# Altium schematic symbol library 13-Logicold 逻辑 IC.SchLib: 297 symbols (part 24 of 30) (continued)
## XC6VLX130T-1FFG1156C (continued)
part I pins: A25 IO_L3N_25  (io), A26 IO_L5N_25  (io), A28 IO_L13P_25  (io), A29 IO_L13N_25  (io), A30 IO_L15P_25  (io), A31 IO_L19N_GC_25  (io), B25 IO_L3P_25  (io), B26 IO_L5P_25  (io), B27 IO_L7P_25  (io), B28 IO_L9N_MRCC_25  (io), B30 IO_L15N_25  (io), B31 IO_L19P_GC_25  (io), C24 IO_L1P_25  (io), C25 IO_L1N_25  (io), C27 IO_L7N_25  (io), C28 IO_L9P_MRCC_25  (io), C29 IO_L10P_MRCC_25  (io), C30 IO_L17P_25  (io), D24 IO_L8P_SRCC_25  (io), D25 IO_L0P_25  (io), D26 IO_L0N_25  (io), D27 IO_L4P_25  (io), D29 IO_L10N_MRCC_25  (io), D30 IO_L17N_25  (io), E24 IO_L8N_SRCC_25  (io), E26 IO_L2P_25  (io), E27 IO_L4N_VREF_25  (io), E28 IO_L14N_VREF_25  (io), E29 IO_L16P_VRN_25  (io), F25 IO_L11P_SRCC_25  (io), F26 IO_L2N_25  (io), F28 IO_L14P_25  (io), F29 IO_L16N_VRP_25  (io), G25 IO_L11N_SRCC_25  (io), G26 IO_L6P_25  (io), G27 IO_L6N_25  (io), G28 IO_L12N_25  (io), H27 IO_L12P_25  (io), H28 IO_L18P_GC_25  (io), H29 IO_L18N_GC_25  (io)
part J pins: A18 IO_L15P_26  (io), A19 IO_L15N_26  (io), A20 IO_L7P_26  (io), A21 IO_L7N_26  (io), A23 IO_L1P_26  (io), A24 IO_L1N_26  (io), B18 IO_L17P_26  (io), B20 IO_L9P_MRCC_26  (io), B21 IO_L5P_26  (io), B22 IO_L5N_26  (io), B23 IO_L3P_26  (io), C18 IO_L17N_26  (io), C19 IO_L9N_MRCC_26  (io), C20 IO_L0P_26  (io), C22 IO_L19P_26  (io), C23 IO_L3N_26  (io), D19 IO_L13N_26  (io), D20 IO_L0N_26  (io), D21 IO_L12P_VRN_26  (io), D22 IO_L19N_26  (io), E19 IO_L13P_26  (io), E21 IO_L12N_VRP_26  (io), E22 IO_L6P_26  (io), E23 IO_L6N_26  (io), F19 IO_L8P_SRCC_26  (io), F20 IO_L8N_SRCC_26  (io), F21 IO_L10P_MRCC_26  (io), G20 IO_L10N_MRCC_26  (io), G21 IO_L2P_26  (io), G22 IO_L2N_26  (io), H19 IO_L11P_SRCC_26  (io), H20 IO_L11N_SRCC_26  (io), H22 IO_L14P_26  (io), J20 IO_L4P_26  (io), J21 IO_L4N_VREF_26  (io), J22 IO_L14N_VREF_26  (io), K21 IO_L16P_26  (io), K22 IO_L16N_26  (io), L20 IO_L18P_26  (io), L21 IO_L18N_26  (io)
part K pins: AC15 IO_L9P_MRCC_32  (io), AC17 IO_L11N_SRCC_32  (io), AC18 IO_L11P_SRCC_32  (io), AD15 IO_L9N_MRCC_32  (io), AD16 IO_L10N_MRCC_32  (io), AD17 IO_L16P_32  (io), AE16 IO_L10P_MRCC_32  (io), AE17 IO_L16N_32  (io), AE18 IO_L18P_32  (io), AF15 IO_L0N_32  (io), AF16 IO_L4N_VREF_32  (io), AF18 IO_L18N_32  (io), AG15 IO_L0P_32  (io), AG16 IO_L4P_32  (io), AG17 IO_L8N_SRCC_32  (io), AG18 IO_L12N_VRP_32  (io), AH15 IO_L2N_32  (io), AH17 IO_L8P_SRCC_32  (io), AH18 IO_L12P_VRN_32  (io), AH19 IO_L14N_VREF_32  (io), AJ14 IO_L1N_32  (io), AJ15 IO_L2P_32  (io), AJ16 IO_L6N_32  (io), AJ17 IO_L6P_32  (io), AJ19 IO_L14P_32  (io), AK14 IO_L1P_32  (io), AK16 IO_L19N_32  (io), AK17 IO_L17N_32  (io), AK18 IO_L17P_32  (io), AL14 IO_L3N_32  (io), AL15 IO_L3P_32  (io), AL16 IO_L19P_32  (io), AM15 IO_L5N_32  (io), AM16 IO_L15N_32  (io), AM17 IO_L15P_32  (io), AN15 IO_L5P_32  (io), AN17 IO_L13P_32  (io), AP15 IO_L7N_32  (io), AP16 IO_L7P_32  (io), AP17 IO_L13N_32  (io)
part L pins: AC12 IO_L9N_MRCC_33  (io), AC13 IO_L9P_MRCC_33  (io), AC14 IO_L2N_33  (io), AD11 IO_L10N_MRCC_33  (io), AD12 IO_L10P_MRCC_33  (io), AD14 IO_L2P_33  (io), AE11 IO_L4N_VREF_33  (io), AE12 IO_L0N_33  (io), AE13 IO_L0P_33  (io), AE14 IO_L14P_33  (io), AF11 IO_L4P_33  (io), AF13 IO_L12P_VRN_33  (io), AF14 IO_L14N_VREF_33  (io), AG10 IO_L6N_33  (io), AG11 IO_L6P_33  (io), AG12 IO_L16P_33  (io), AG13 IO_L12N_VRP_33  (io), AH10 IO_L8N_SRCC_33  (io), AH12 IO_L16N_33  (io), AH13 IO_L18P_33  (io), AH14 IO_L18N_33  (io), AJ10 IO_L8P_SRCC_33  (io), AJ11 IO_L1P_33  (io), AJ12 IO_L3N_33  (io), AK11 IO_L1N_33  (io), AK12 IO_L3P_33  (io), AK13 IO_L17P_33  (io), AL10 IO_L5N_33  (io), AL11 IO_L7P_33  (io), AL13 IO_L17N_33  (io), AM10 IO_L5P_33  (io), AM11 IO_L7N_33  (io), AM12 IO_L13P_33  (io), AM13 IO_L15N_33  (io), AN12 IO_L13N_33  (io), AN13 IO_L15P_33  (io), AN14 IO_L19N_33  (io), AP11 IO_L11P_SRCC_33  (io), AP12 IO_L11N_SRCC_33  (io), AP14 IO_L19P_33  (io)
part M pins: A8 IO_L5N_A08_D24_34  (io), A9 IO_L5P_A09_D25_34  (io), A10 IO_L1P_GC_34  (io), AB10 IO_L10N_MRCC_34  (io), AC9 IO_L12N_A02_D18_34  (io), AC10 IO_L10P_MRCC_34  (io), AD9 IO_L14P_A25_34  (io), AD10 IO_L12P_A03_D19_34  (io), AE9 IO_L14N_VREF_A24_34  (io), AF9 IO_L16P_A21_34  (io), AF10 IO_L16N_A20_34  (io), AG8 IO_L18P_A17_34  (io), AH8 IO_L18N_A16_34  (io), AH9 IO_L11P_SRCC_34  (io), AJ9 IO_L11N_SRCC_34  (io), AK8 IO_L13P_A01_D17_34  (io), AK9 IO_L15P_A23_34  (io), AL8 IO_L13N_A00_D16_34  (io), AL9 IO_L15N_A22_34  (io), AN9 IO_L17P_A19_34  (io), AN10 IO_L19P_VRN_34  (io), AP9 IO_L17N_A18_34  (io), AP10 IO_L19N_VRP_34  (io), B8 IO_L7P_A05_D21_34  (io), B10 IO_L1N_GC_34  (io), C8 IO_L7N_A04_D20_34  (io), C9 IO_L4P_A11_D27_34  (io), C10 IO_L3P_A13_D29_34  (io), D9 IO_L4N_VREF_A10_D26_34  (io), D10 IO_L3N_A12_D28_34  (io), E8 IO_L6P_A07_D23_34  (io), E9 IO_L6N_A06_D22_34  (io), F9 IO_L2P_A15_D31_34  (io), F10 IO_L2N_A14_D30_34  (io), H9 IO_L0N_GC_34  (io), J9 IO_L0P_GC_34  (io), K9 IO_L8N_SRCC_34  (io), L9 IO_L8P_SRCC_34  (io), L10 IO_L9P_MRCC_34  (io), M10 IO_L9N_MRCC_34  (io)
part N pins: A11 IO_L13P_SM6P_35  (io), A13 IO_L3P_SM1P_35  (io), A14 IO_L3N_SM1N_35  (io), B11 IO_L13N_SM6N_35  (io), B12 IO_L7P_SM4P_35  (io), B13 IO_L7N_SM4N_35  (io), C12 IO_L11N_SRCC_35  (io), C13 IO_L11P_SRCC_35  (io), C14 IO_L1N_35  (io), D11 IO_L19P_GC_35  (io), D12 IO_L17P_35  (io), D14 IO_L1P_35  (io), E11 IO_L19N_GC_35  (io), E12 IO_L17N_35  (io), E13 IO_L15P_SM7P_35  (io), E14 IO_L5N_SM2N_35  (io), F11 IO_L2N_SM0N_35  (io), F13 IO_L15N_SM7N_35  (io), F14 IO_L5P_SM2P_35  (io), G10 IO_L6N_SM3N_35  (io), G11 IO_L2P_SM0P_35  (io), G12 IO_L4P_35  (io), G13 IO_L0P_35  (io), H10 IO_L6P_SM3P_35  (io), H12 IO_L12P_SM5P_35  (io), H13 IO_L4N_VREF_35  (io), H14 IO_L0N_35  (io), J10 IO_L14N_VREF_35  (io), J11 IO_L14P_35  (io), J12 IO_L12N_SM5N_35  (io), J14 IO_L8N_SRCC_35  (io), K11 IO_L16P_VRN_35  (io), K12 IO_L18N_GC_35  (io), K13 IO_L18P_GC_35  (io), K14 IO_L8P_SRCC_35  (io), L11 IO_L16N_VRP_35  (io), L13 IO_L9P_MRCC_35  (io), M11 IO_L10N_MRCC_35  (io), M12 IO_L10P_MRCC_35  (io), M13 IO_L9N_MRCC_35  (io)
part O pins: A15 IO_L15P_36  (io), A16 IO_L11P_SRCC_36  (io), B15 IO_L15N_36  (io), B16 IO_L11N_SRCC_36  (io), B17 IO_L5N_36  (io), C15 IO_L19N_36  (io), C17 IO_L5P_36  (io), D15 IO_L19P_36  (io), D16 IO_L13N_36  (io), D17 IO_L1N_36  (io), E16 IO_L13P_36  (io), E17 IO_L0N_36  (io), E18 IO_L1P_36  (io), F15 IO_L16N_36  (io), F16 IO_L12P_VRN_36  (io), F18 IO_L0P_36  (io), G15 IO_L16P_36  (io), G16 IO_L12N_VRP_36  (io), G17 IO_L3N_36  (io), G18 IO_L8P_SRCC_36  (io), H15 IO_L18P_36  (io), H17 IO_L3P_36  (io), H18 IO_L8N_SRCC_36  (io), J15 IO_L18N_36  (io), J16 IO_L14N_VREF_36  (io), J17 IO_L14P_36  (io), J19 IO_L6N_36  (io), K16 IO_L9P_MRCC_36  (io), K17 IO_L2N_36  (io), K18 IO_L2P_36  (io), K19 IO_L6P_36  (io), L14 IO_L10N_MRCC_36  (io), L15 IO_L10P_MRCC_36  (io), L16 IO_L9N_MRCC_36  (io), L18 IO_L4N_VREF_36  (io), L19 IO_L4P_36  (io), M15 IO_L17N_36  (io), M16 IO_L17P_36  (io), M17 IO_L7N_36  (io), M18 IO_L7P_36  (io)
part P pins: AH5 MGTREFCLK1N_112  (in), AH6 MGTREFCLK1P_112  (in), AJ3 MGTRXP3_112  (in), AJ4 MGTRXN3_112  (in), AK1 MGTTXP3_112  (out), AK2 MGTTXN3_112  (out), AK5 MGTREFCLK0N_112  (in), AK6 MGTREFCLK0P_112  (in), AL3 MGTRXP2_112  (in), AL4 MGTRXN2_112  (in), AM1 MGTTXP2_112  (out), AM2 MGTTXN2_112  (out), AM5 MGTRXP1_112  (in), AM6 MGTRXN1_112  (in), AN3 MGTTXP1_112  (out), AN4 MGTTXN1_112  (out), AP1 MGTTXP0_112  (out), AP2 MGTTXN0_112  (out), AP5 MGTRXP0_112  (in), AP6 MGTRXN0_112  (in)
part Q pins: AB1 MGTTXP3_113  (out), AB2 MGTTXN3_113  (out), AB5 MGTREFCLK1N_113  (in), AB6 MGTREFCLK1P_113  (in), AC3 MGTRXP3_113  (in), AC4 MGTRXN3_113  (in), AD1 MGTTXP2_113  (out), AD2 MGTTXN2_113  (out), AD5 MGTREFCLK0N_113  (in), AD6 MGTREFCLK0P_113  (in), AE3 MGTRXP2_113  (in), AE4 MGTRXN2_113  (in), AF1 MGTTXP1_113  (out), AF2 MGTTXN1_113  (out), AF5 MGTRXP1_113  (in), AF6 MGTRXN1_113  (in), AG3 MGTRXP0_113  (in), AG4 MGTRXN0_113  (in), AH1 MGTTXP0_113  (out), AH2 MGTTXN0_113  (out)
part R pins: AA3 MGTRXP0_114  (in), AA4 MGTRXN0_114  (in), P1 MGTTXP3_114  (out), P2 MGTTXN3_114  (out), R3 MGTRXP3_114  (in), R4 MGTRXN3_114  (in), T1 MGTTXP2_114  (out), T2 MGTTXN2_114  (out), T5 MGTREFCLK1N_114  (in), T6 MGTREFCLK1P_114  (in), U3 MGTRXP2_114  (in), U4 MGTRXN2_114  (in), V1 MGTTXP1_114  (out), V2 MGTTXN1_114  (out), V5 MGTREFCLK0N_114  (in), V6 MGTREFCLK0P_114  (in), W3 MGTRXP1_114  (in), W4 MGTRXN1_114  (in), Y1 MGTTXP0_114  (out), Y2 MGTTXN0_114  (out)
part S pins: AN7 MGTRREF_115  (in), AP7 MGTAVTTRCAL_115 , F1 MGTTXP3_115  (out), F2 MGTTXN3_115  (out), H1 MGTTXP2_115  (out), H2 MGTTXN2_115  (out), J3 MGTRXP3_115  (in), J4 MGTRXN3_115  (in), K1 MGTTXP1_115  (out), K2 MGTTXN1_115  (out), K5 MGTRXP2_115  (in), K6 MGTRXN2_115  (in), L3 MGTRXP1_115  (in), L4 MGTRXN1_115  (in), M1 MGTTXP0_115  (out), M2 MGTTXN0_115  (out), M5 MGTREFCLK1N_115  (in), M6 MGTREFCLK1P_115  (in), N3 MGTRXP0_115  (in), N4 MGTRXN0_115  (in), P5 MGTREFCLK0N_115  (in), P6 MGTREFCLK0P_115  (in)
part T pins: A3 MGTTXP3_116  (out), A4 MGTTXN3_116  (out), B1 MGTTXP2_116  (out), B2 MGTTXN2_116  (out), B5 MGTRXP3_116  (in), B6 MGTRXN3_116  (in), C3 MGTTXP1_116  (out), C4 MGTTXN1_116  (out), D1 MGTTXP0_116  (out), D2 MGTTXN0_116  (out), D5 MGTRXP2_116  (in), D6 MGTRXN2_116  (in), E3 MGTRXP1_116  (in), E4 MGTRXN1_116  (in), F5 MGTREFCLK1N_116  (in), F6 MGTREFCLK1P_116  (in), G3 MGTRXP0_116  (in), G4 MGTRXN0_116  (in), H5 MGTREFCLK0N_116  (in), H6 MGTREFCLK0P_116  (in)
part U pins: AA8 DOUT_BUSY_0  (out), AC8 TDO_0  (out), AD8 TDI_0  (in), AE8 TCK_0  (in), AF8 TMS_0  (in), F8 CSI_B_0  (in), G8 RDWR_B_0  (in), H8 DIN_0  (in), K8 CCLK_0  (io), L8 PROGRAM_B_0  (in), M8 HSWAPEN_0  (in), P8 INIT_B_0  (oc), R8 DONE_0  (io), U8 M0_0  (in), V8 M2_0  (in), W8 M1_0  (in), W17 DXN_0 , W18 DXP_0 
part V pins: A12 VCCO_35  (power), A22 VCCO_26  (power), A32 VCCO_16  (power), AA32 VCCO_13  (power), AB9 VCCO_0  (power), AB29 VCCO_13  (power), AC16 VCCO_32  (power), AC26 VCCO_13  (power), AD13 VCCO_33  (power), AD23 VCCO_24  (power), AD33 VCCO_13  (power), AE10 VCCO_34  (power), AE20 VCCO_22  (power), AE30 VCCO_13  (power), AF17 VCCO_32  (power), AF27 VCCO_12  (power), AG14 VCCO_33  (power), AG24 VCCO_24  (power), AG34 VCCO_12  (power), AH11 VCCO_33  (power), AH21 VCCO_22  (power), AH31 VCCO_12  (power), AJ8 VCCO_34  (power), AJ18 VCCO_32  (power), AJ28 VCCO_23  (power), AK15 VCCO_32  (power), AK25 VCCO_23  (power), AL12 VCCO_33  (power), AL22 VCCO_22  (power), AL32 VCCO_12  (power), AM9 VCCO_34  (power), AM19 VCCO_22  (power), AM29 VCCO_23  (power), AN16 VCCO_32  (power), AN26 VCCO_23  (power), AP13 VCCO_33  (power), AP23 VCCO_22  (power), B9 VCCO_34  (power), B19 VCCO_26  (power), B29 VCCO_25  (power), C16 VCCO_36  (power), C26 VCCO_25  (power), D13 VCCO_35  (power), D23 VCCO_26  (power), D33 VCCO_16  (power), E10 VCCO_34  (power), E20 VCCO_26  (power), E30 VCCO_25  (power), F17 VCCO_36  (power), F27 VCCO_25  (power), G14 VCCO_35  (power), G24 VCCO_24  (power), G34 VCCO_16  (power), H11 VCCO_35  (power), H21 VCCO_26  (power), H31 VCCO_16  (power), J18 VCCO_36  (power), J28 VCCO_16  (power), K15 VCCO_36  (power), K25 VCCO_16  (power), L12 VCCO_35  (power), L22 VCCO_24  (power), L32 VCCO_15  (power), M9 VCCO_34  (power), M29 VCCO_15  (power), N26 VCCO_15  (power), P33 VCCO_15  (power), R30 VCCO_15  (power), T27 VCCO_14  (power), U24 VCCO_24  (power), U34 VCCO_14  (power), V31 VCCO_14  (power), W28 VCCO_14  (power), Y9 VCCO_0  (power), Y25 VCCO_24  (power)
part W pins: AA6 MGTAVCC_S  (power), AC2 MGTAVTT_S  (power), AC6 MGTAVCC_S  (power), AD3 MGTAVTT_S  (power), AE6 MGTAVCC_S  (power), AG2 MGTAVTT_S  (power), AG6 MGTAVCC_S  (power), AH3 MGTAVTT_S  (power), AJ6 MGTAVCC_S  (power), AL2 MGTAVTT_S  (power), AL6 MGTAVCC_S  (power), AM3 MGTAVTT_S  (power), AN6 MGTAVCC_S  (power), C2 MGTAVTT_N  (power), C6 MGTAVCC_N  (power), D3 MGTAVTT_N  (power), E6 MGTAVCC_N  (power), G2 MGTAVTT_N  (power), G6 MGTAVCC_N  (power), H3 MGTAVTT_N  (power), J6 MGTAVCC_N  (power), L2 MGTAVTT_N  (power), L6 MGTAVCC_N  (power), M3 MGTAVTT_N  (power), N6 MGTAVCC_N  (power), N8 VBATT_0  (power), R2 MGTAVTT_S  (power), R6 MGTAVCC_S  (power), T3 MGTAVTT_S  (power), T17 AVSS_0  (power), T18 AVDD_0  (power), U6 MGTAVCC_S  (power), U17 VREFN_0  (power), U18 VP_0  (in), V17 VN_0  (in), V18 VREFP_0  (power), W2 MGTAVTT_S  (power), W6 MGTAVCC_S  (power), Y3 MGTAVTT_S  (power), Y8 VFS_0  (in)
part X pins: AA10 VCCAUX  (power), AA12 VCCINT  (power), AA14 VCCINT  (power), AA16 VCCINT  (power), AA18 VCCINT  (power), AA20 VCCINT  (power), AA22 VCCAUX  (power), AB11 VCCINT  (power), AB13 VCCINT  (power), AB15 VCCINT  (power), AB17 VCCINT  (power), AB19 VCCINT  (power), AB21 VCCINT  (power), M19 VCCINT  (power), M21 VCCINT  (power), N10 VCCAUX  (power), N12 VCCINT  (power), N14 VCCINT  (power), N16 VCCINT  (power), N18 VCCINT  (power), N20 VCCINT  (power), N22 VCCAUX  (power), P9 VCCAUX  (power), P11 VCCINT  (power), P13 VCCINT  (power), P15 VCCINT  (power), P17 VCCINT  (power), P19 VCCINT  (power), P21 VCCINT  (power), P23 VCCAUX  (power), R10 VCCINT  (power), R12 VCCINT  (power), R14 VCCINT  (power), R16 VCCINT  (power), R18 VCCINT  (power), R20 VCCINT  (power), R22 VCCAUX  (power), T9 VCCAUX  (power), T11 VCCINT  (power), T13 VCCINT  (power), T15 VCCINT  (power), T19 VCCINT  (power), T21 VCCINT  (power), U10 VCCINT  (power), U12 VCCINT  (power), U14 VCCINT  (power), U16 VCCINT  (power), U20 VCCINT  (power), U22 VCCAUX  (power), V9 VCCAUX  (power), V11 VCCINT  (power), V13 VCCINT  (power), V15 VCCINT  (power), V19 VCCINT  (power), V21 VCCINT  (power), W10 VCCAUX  (power), W12 VCCINT  (power), W14 VCCINT  (power), W16 VCCINT  (power), W20 VCCINT  (power), W22 VCCAUX  (power), Y11 VCCINT  (power), Y13 VCCINT  (power), Y15 VCCINT  (power), Y17 VCCINT  (power), Y19 VCCINT  (power), Y21 VCCINT  (power), Y23 VCCAUX  (power)
part Y pins: A1 GND  (power), A2 GND  (power), A5 GND  (power), A6 GND  (power), A7 GND  (power), A17 GND  (power), A27 GND  (power), A34 GND  (power), B3 GND  (power), B4 GND  (power), B7 GND  (power), B14 GND  (power), B24 GND  (power), C1 GND  (power), C5 GND  (power), C7 GND  (power), C11 GND  (power), C21 GND  (power), C31 GND  (power), D4 GND  (power), D7 GND  (power), D8 GND  (power), D18 GND  (power), D28 GND  (power), E1 GND  (power), E2 GND  (power), E5 GND  (power), E7 GND  (power), E15 GND  (power), E25 GND  (power), F3 GND  (power), F4 GND  (power), F7 GND  (power), F12 GND  (power), F22 GND  (power), F32 GND  (power), G1 GND  (power), G5 GND  (power), G7 GND  (power), G9 GND  (power), G19 GND  (power), G29 GND  (power), H4 GND  (power), H7 GND  (power), H16 GND  (power), H26 GND  (power), J1 GND  (power), J2 GND  (power), J5 GND  (power), J7 GND  (power), J8 GND  (power), J13 GND  (power), J23 GND  (power), J33 GND  (power), K3 GND  (power), K4 GND  (power), K7 GND  (power), K10 GND  (power), K20 GND  (power), K30 GND  (power), L1 GND  (power), L5 GND  (power), L7 GND  (power), L17 GND  (power), L27 GND  (power), M4 GND  (power), M7 GND  (power), M14 GND  (power), M20 GND  (power), M24 GND  (power), M34 GND  (power), N1 GND  (power), N2 GND  (power), N5 GND  (power), N7 GND  (power), N9 GND  (power), N11 GND  (power), N13 GND  (power), N15 GND  (power), N17 GND  (power), N19 GND  (power), N21 GND  (power), N31 GND  (power), P3 GND  (power), P4 GND  (power), P7 GND  (power), P10 GND  (power), P12 GND  (power), P14 GND  (power), P16 GND  (power), P18 GND  (power), P20 GND  (power), P22 GND  (power), P28 GND  (power), R1 GND  (power), R5 GND  (power), R7 GND  (power), R9 GND  (power), R11 GND  (power), R13 GND  (power), R15 GND  (power), R17 GND  (power), R19 GND  (power), R21 GND  (power), R23 GND  (power), R25 GND  (power), T4 GND  (power), T7 GND  (power), T8 GND  (power), T10 GND  (power), T12 GND  (power), T14 GND  (power), T16 GND  (power), T20 GND  (power), T22 GND  (power), T32 GND  (power), U1 GND  (power), U2 GND  (power), U5 GND  (power), U7 GND  (power), U9 GND  (power), U11 GND  (power), U13 GND  (power), U15 GND  (power), U19 GND  (power), U21 GND  (power), U29 GND  (power)
part Z pins: AA1 GND  (power), AA2 GND  (power), AA5 GND  (power), AA7 GND  (power), AA9 GND  (power), AA11 GND  (power), AA13 GND  (power), AA15 GND  (power), AA17 GND  (power), AA19 GND  (power), AA21 GND  (power), AA27 GND  (power), AB3 GND  (power), AB4 GND  (power), AB7 GND  (power), AB8 GND  (power), AB12 GND  (power), AB14 GND  (power), AB16 GND  (power), AB18 GND  (power), AB20 GND  (power), AB22 GND  (power), AB24 GND  (power), AB34 GND  (power), AC1 GND  (power), AC5 GND  (power), AC7 GND  (power), AC11 GND  (power), AC21 GND  (power), AC31 GND  (power), AD4 GND  (power), AD7 GND  (power), AD18 GND  (power), AD28 GND  (power), AE1 GND  (power), AE2 GND  (power), AE5 GND  (power), AE7 GND  (power), AE15 GND  (power), AE25 GND  (power), AF3 GND  (power), AF4 GND  (power), AF7 GND  (power), AF12 GND  (power), AF22 GND  (power), AF32 GND  (power), AG1 GND  (power), AG5 GND  (power), AG7 GND  (power), AG9 GND  (power), AG19 GND  (power), AG29 GND  (power), AH4 GND  (power), AH7 GND  (power), AH16 GND  (power), AH26 GND  (power), AJ1 GND  (power), AJ2 GND  (power), AJ5 GND  (power), AJ7 GND  (power), AJ13 GND  (power), AJ23 GND  (power), AJ33 GND  (power), AK3 GND  (power), AK4 GND  (power), AK7 GND  (power), AK10 GND  (power), AK20 GND  (power), AK30 GND  (power), AL1 GND  (power), AL5 GND  (power), AL7 GND  (power), AL17 GND  (power), AL27 GND  (power), AM4 GND  (power), AM7 GND  (power), AM8 GND  (power), AM14 GND  (power), AM24 GND  (power), AM34 GND  (power), AN1 GND  (power), AN2 GND  (power), AN5 GND  (power), AN8 GND  (power), AN11 GND  (power), AN21 GND  (power), AN31 GND  (power), AP3 GND  (power), AP4 GND  (power), AP8 GND  (power), AP18 GND  (power), AP28 GND  (power), AP34 GND  (power), V3 GND  (power), V4 GND  (power), V7 GND  (power), V10 GND  (power), V12 GND  (power), V14 GND  (power), V16 GND  (power), V20 GND  (power), V22 GND  (power), V26 GND  (power), W1 GND  (power), W5 GND  (power), W7 GND  (power), W9 GND  (power), W11 GND  (power), W13 GND  (power), W15 GND  (power), W19 GND  (power), W21 GND  (power), W23 GND  (power), W33 GND  (power), Y4 GND  (power), Y5 GND  (power), Y6 GND  (power), Y7 GND  (power), Y10 GND  (power), Y12 GND  (power), Y14 GND  (power), Y16 GND  (power), Y18 GND  (power), Y20 GND  (power), Y22 GND  (power), Y30 GND  (power)
part A text: BANK 12
part B text: BANK 13
part C text: BANK 14
part D text: BANK 15
part E text: BANK 16
part F text: BANK 22
part G text: BANK 23
part H text: BANK 24
part I text: BANK 25
part J text: BANK 26
part K text: BANK 32
part L text: BANK 33
part M text: BANK 34
part N text: BANK 35
part O text: BANK 36

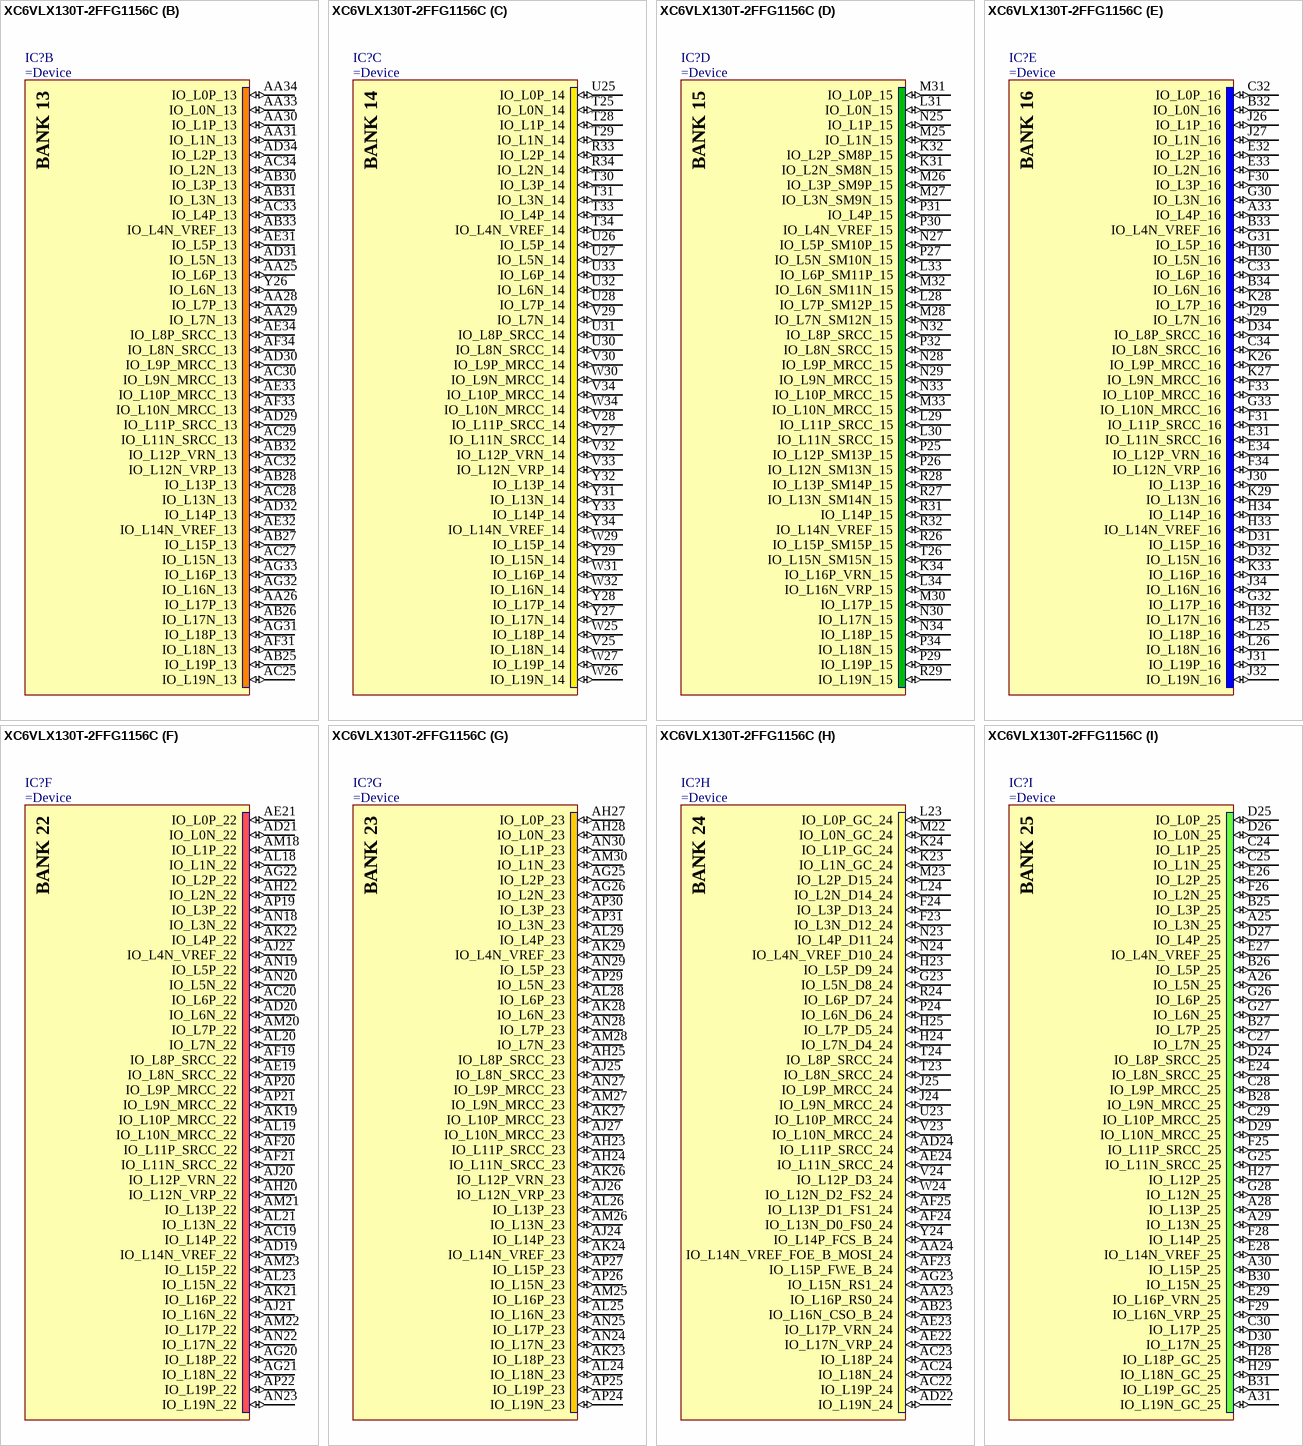
[diagram p132: symbol XC6VLX130T-2FFG1156C]

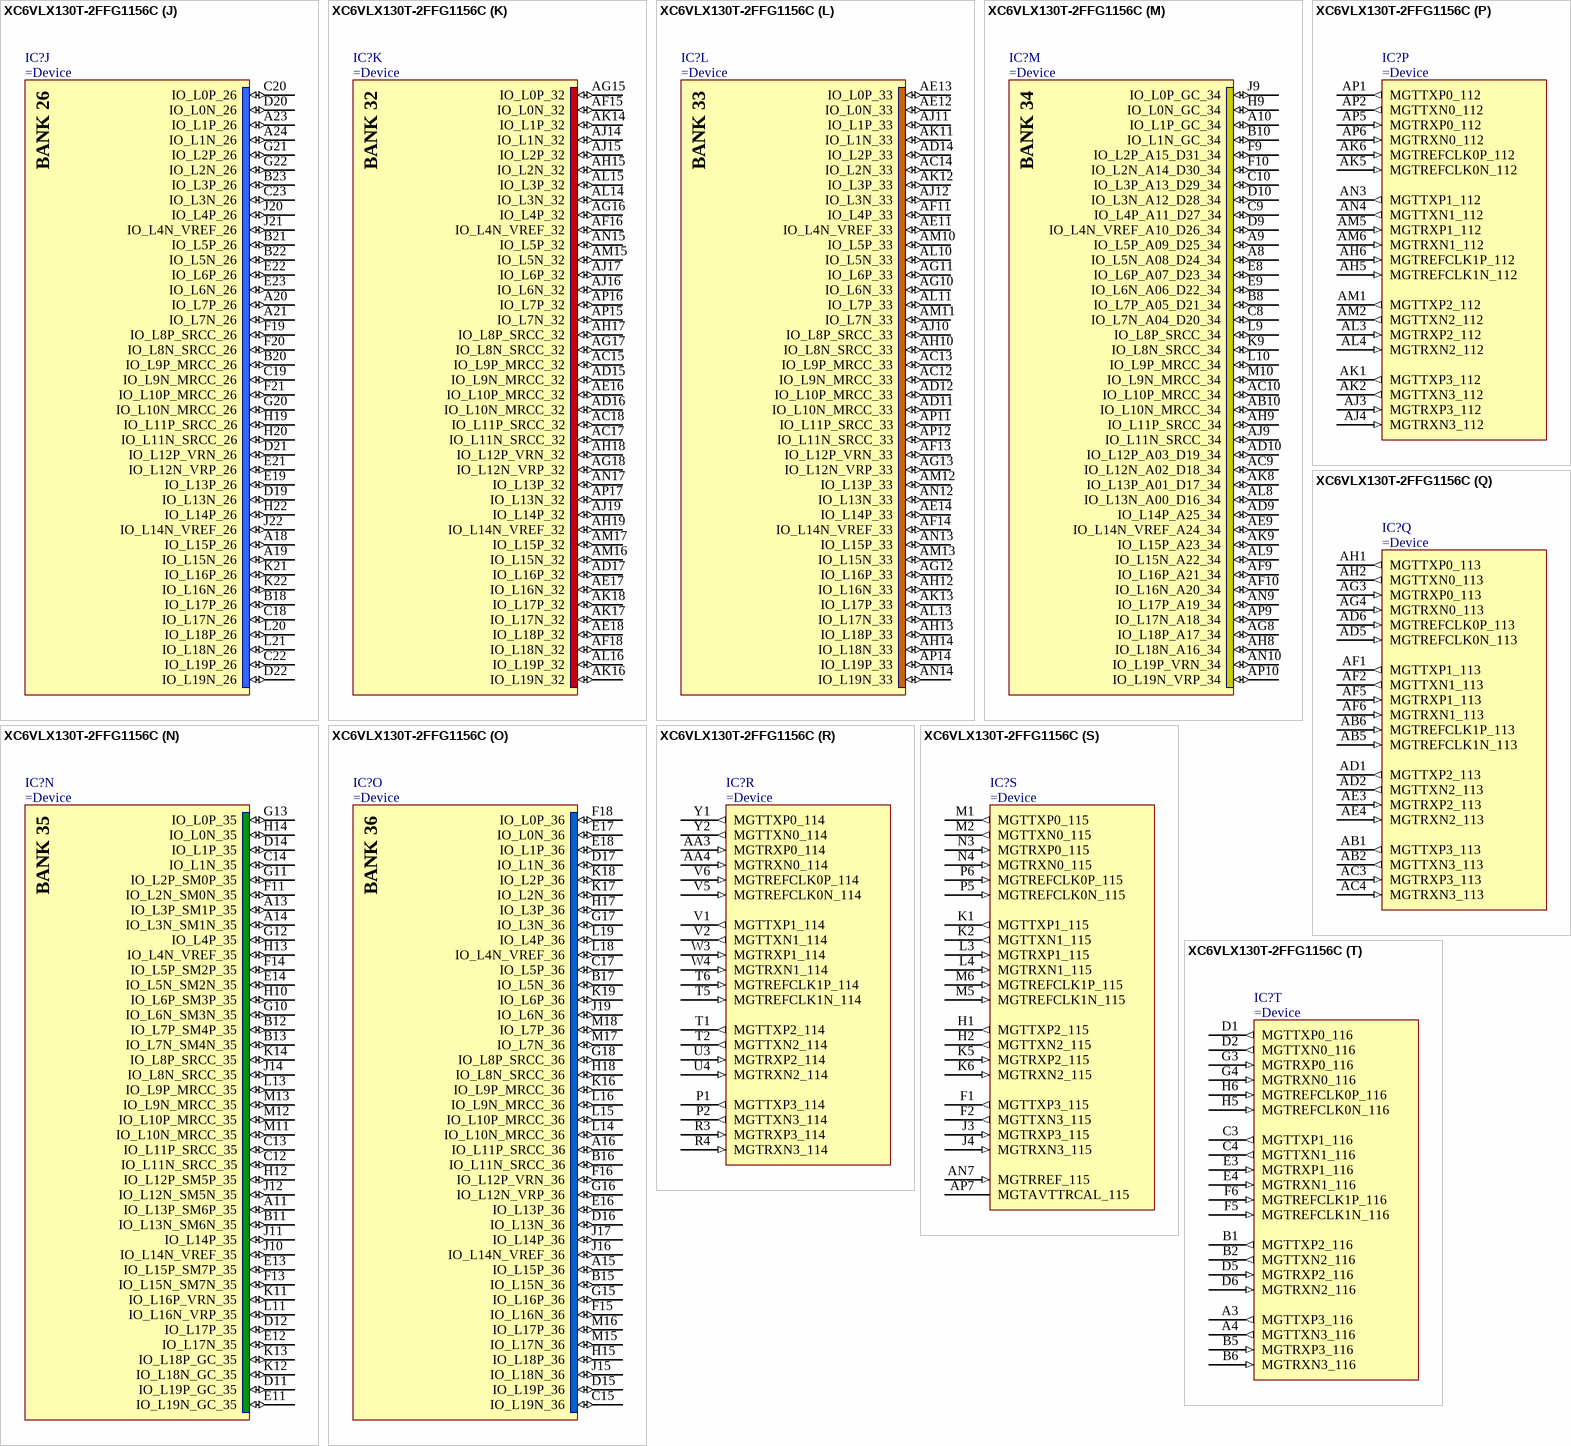
[diagram p133: symbol XC6VLX130T-2FFG1156C]

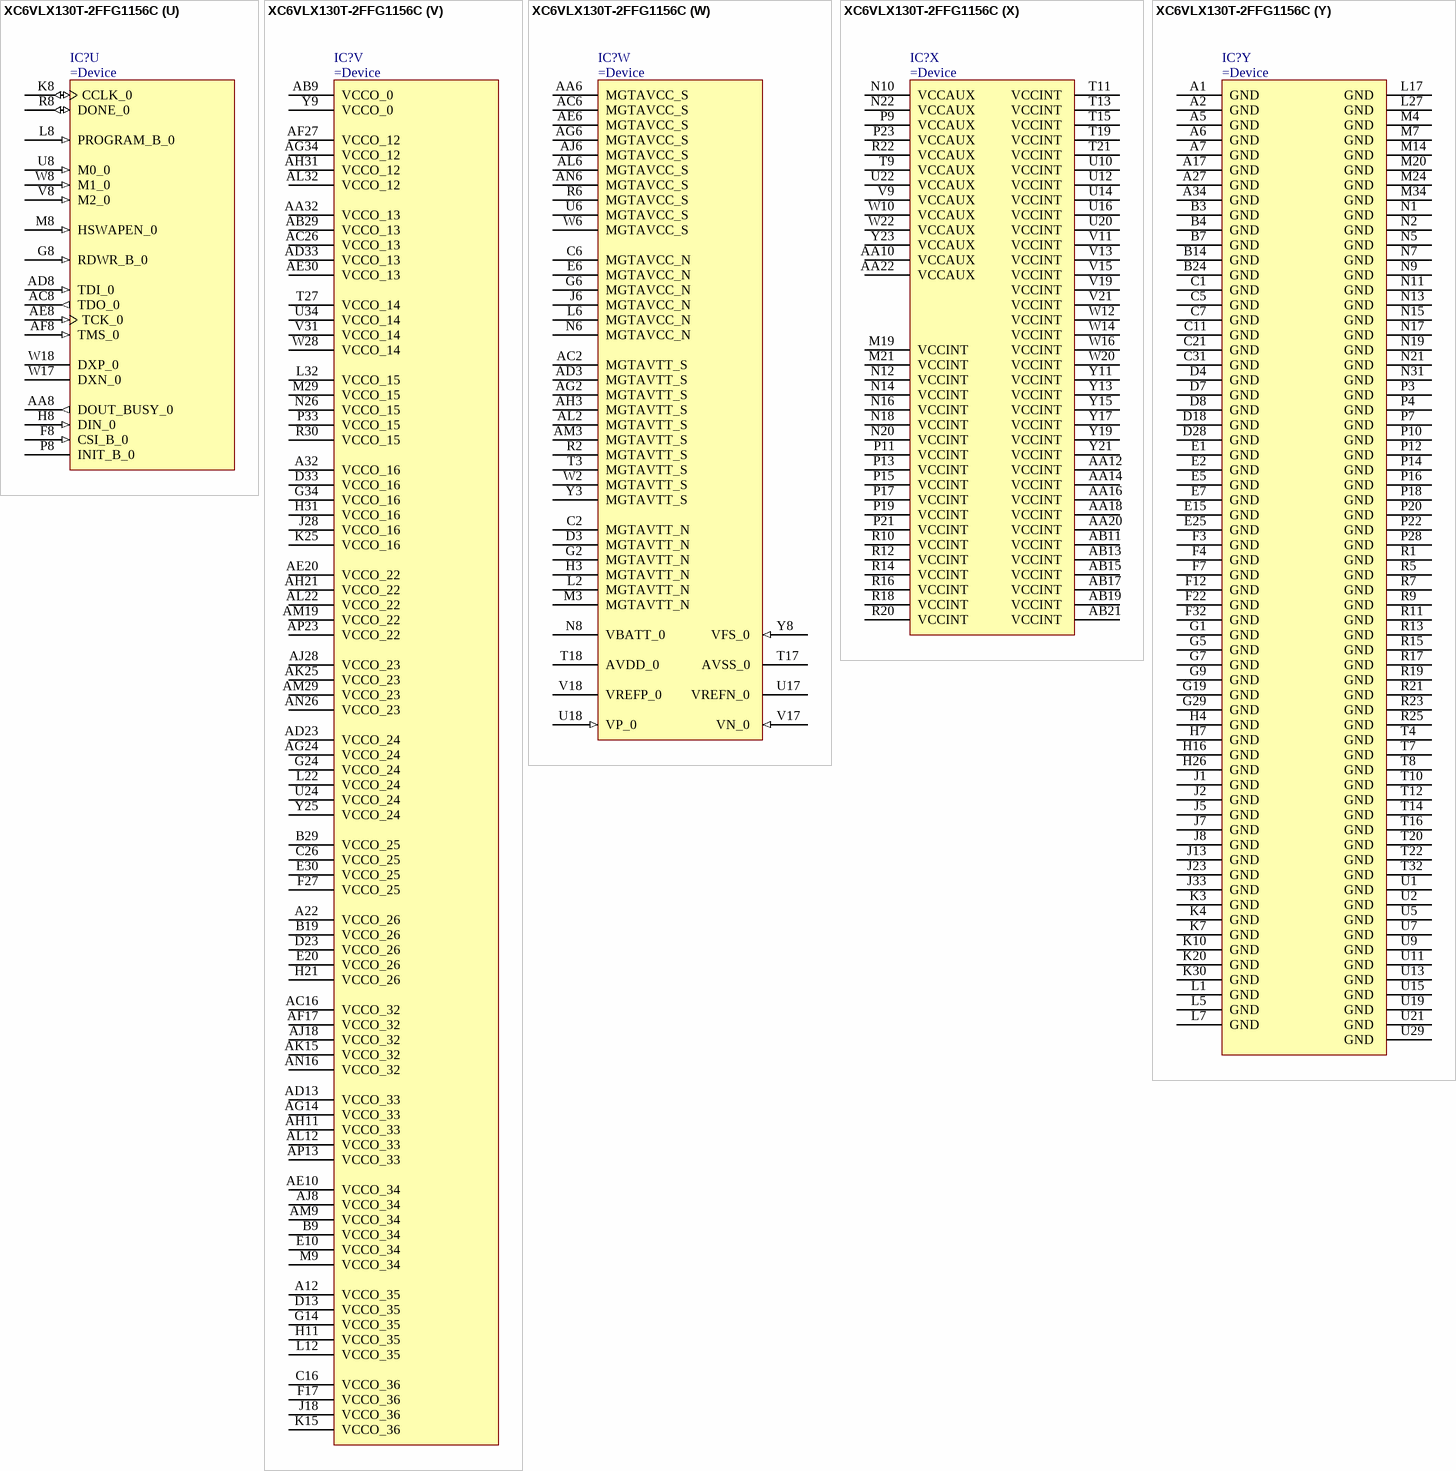
[diagram p134: symbol XC6VLX130T-2FFG1156C]

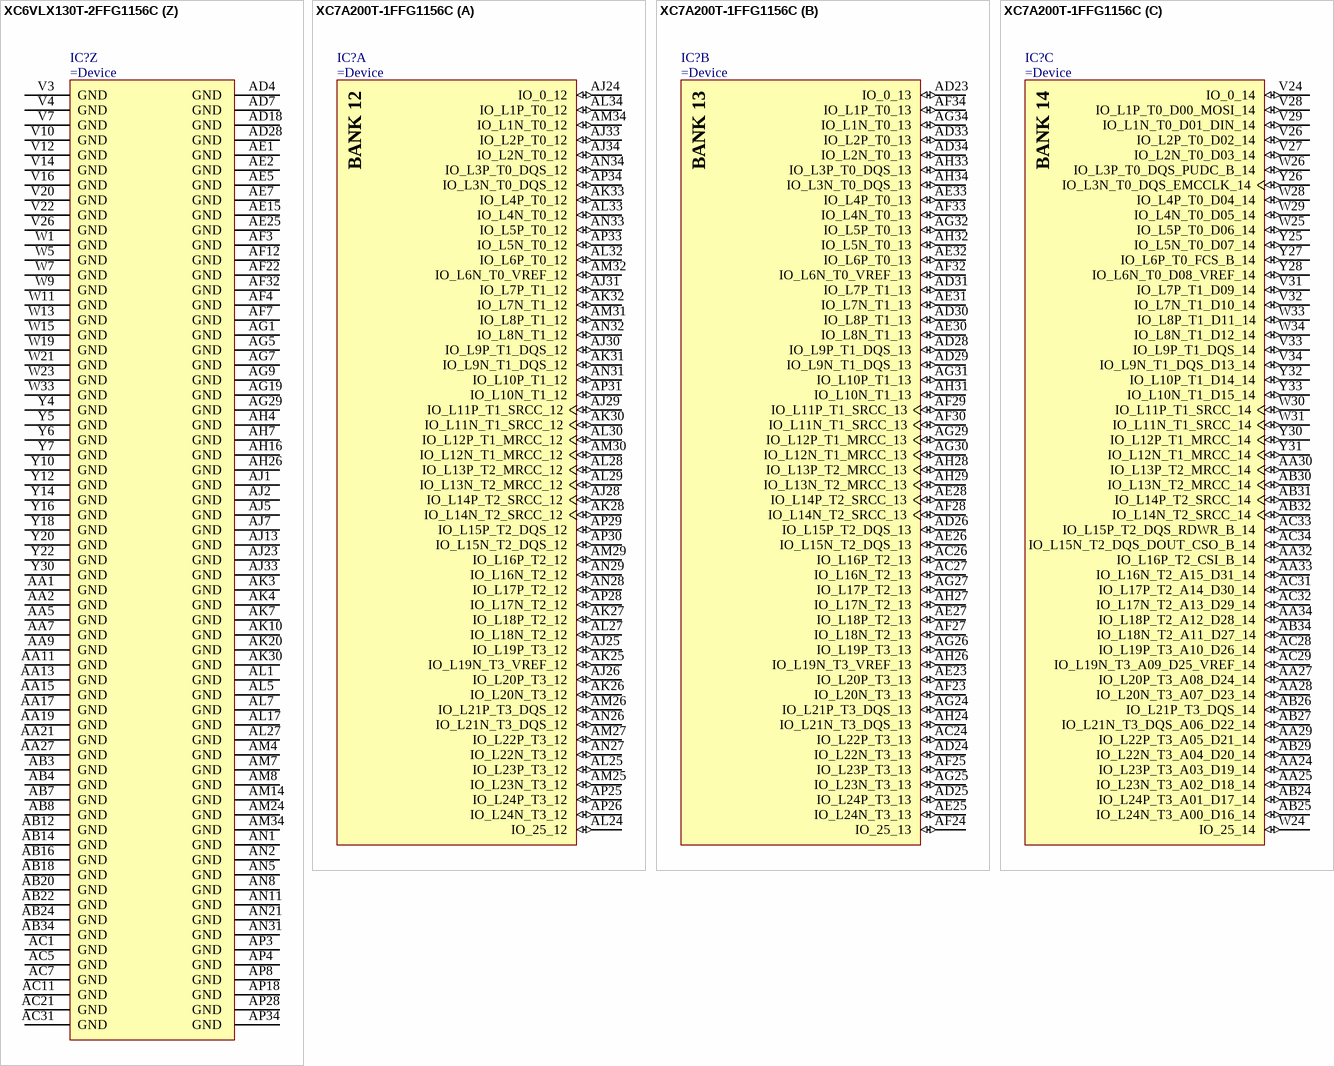
[diagram p135: symbols XC6VLX130T-2FFG1156C to XC7A200T-1FFG1156C]